# Altium footprint library Power_Lib_Altium.PcbLib: 383 footprints (part 18 of 24)
Each footprint in its own frame and in the unit in brackets; x right, y up, seen from the top. Pads: shape width x height; smd on the part's side, far side on the other; paste and mask are expansions set on the pad; w line width, h text height; cw(c..) or ccw(c..) is an arc to the next point about the centre after c.
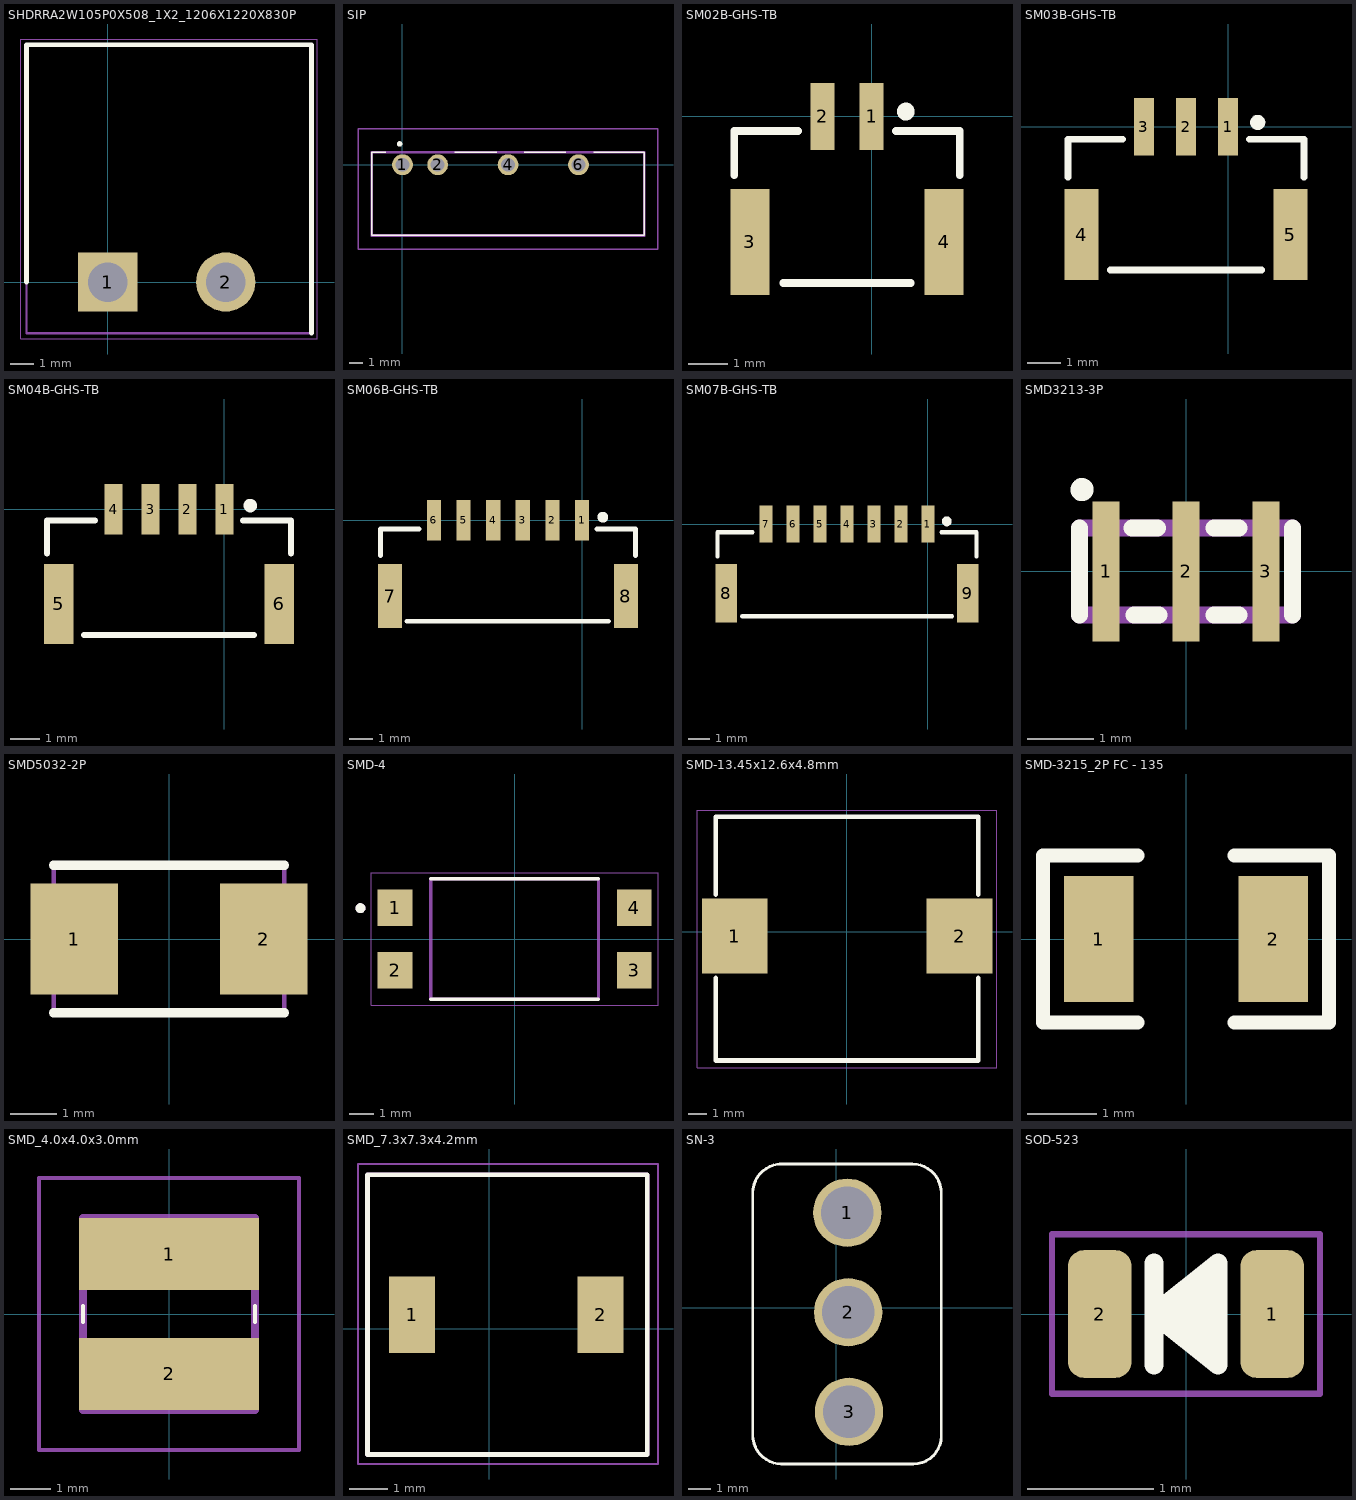
[diagram p17: the footprints below, top view; thin cyan lines are the x and y axes]

## SHDRRA2W105P0X508_1X2_1206X1220X830P [mm]
pads (2):
  rect 2.55x2.55 hole 1.7: 1(0,0)
  round 2.55 hole 1.7: 2(5.08,0)
Top Overlay:
  lines w0.2: -3.49,0 -3.49,10.2 8.77,10.2 8.77,-2.2
Mechanical 13:
  lines w0.1: -3.49,-2.2 8.77,-2.2 8.77,10.2 -3.49,10.2 -3.49,-2.2
Mechanical 15:
  lines w0.05: -3.74,-2.45 -3.74,10.45 9.02,10.45 9.02,-2.45 -3.74,-2.45
3D body "WJ2EDGRC-5.08-2P.stp": height 8.3, standoff -4, extent -3.49,-2.2 8.57,10

## SIP [mm]
pads (4):
  round 1.5 hole 1: 1(0,0) 2(2.54,0) 4(7.62,0) 6(12.7,0)
Top Overlay:
  lines w0.1: -1.21,0.9 -2.21,0.9 -2.21,-5.1 17.44,-5.1 17.44,0.9 13.79,0.9 ; 3.79,0.9 6.79,0.9 ; 8.79,0.9 11.79,0.9
  lines w0.2: -0.31,1.5 cw(c-0.21,1.5) -0.11,1.5 cw(c-0.21,1.5) -0.31,1.5
Mechanical 13:
  lines w0.2: -2.21,-5.1 17.44,-5.1 17.44,0.9 -2.21,0.9 -2.21,-5.1
Mechanical 15:
  lines w0.1: -3.21,-6.1 18.44,-6.1 18.44,2.6 -3.21,2.6 -3.21,-6.1
3D body "IB0505LS-1WR3.stp": height 10.51, standoff -5, extent -2.21,-5.1 17.44,0.9

## SM02B-GHS-TB [mm] "GH02卧式"
height 4.25
pads (4):
  rect 0.6x1.7 smd: 1(0,0) 2(-1.25,0)
  rect 1x2.7 smd: 3(-3.1,-3.2) 4(1.85,-3.2)
Top Overlay:
  circle w0.254: c0.875,0.125 r0.1
  lines w0.2: -3.5,-1.5 -3.5,-0.375 -1.875,-0.375 ; -2.25,-4.25 1,-4.25 ; 0.625,-0.375 2.25,-0.375 2.25,-1.5
3D body "SM02B-GHS-TB.STEP": height 4.35, standoff 0, extent -3.5,-4.3 2.25,0.55

## SM03B-GHS-TB [mm] "GH03卧式"
height 4.25
pads (5):
  rect 0.6x1.7 smd: 1(0,0) 2(-1.25,0) 3(-2.5,0)
  rect 1x2.7 smd: 4(-4.35,-3.2) 5(1.85,-3.2)
Top Overlay:
  circle w0.254: c0.875,0.125 r0.1
  lines w0.2: -4.75,-1.5 -4.75,-0.375 -3.125,-0.375 ; -3.5,-4.25 1,-4.25 ; 0.625,-0.375 2.25,-0.375 2.25,-1.5
3D body "SM03B-GHS-TB.STEP": height 4.35, standoff 0, extent -4.75,-4.3 2.25,0.55

## SM04B-GHS-TB [mm] "GH04卧式"
height 4.25
pads (6):
  rect 0.6x1.7 smd: 1(0,0) 2(-1.25,0) 3(-2.5,0) 4(-3.75,0)
  rect 1x2.7 smd: 5(-5.6,-3.2) 6(1.85,-3.2)
Top Overlay:
  circle w0.254: c0.875,0.125 r0.1
  lines w0.2: -6,-1.5 -6,-0.375 -4.375,-0.375 ; -4.75,-4.25 1,-4.25 ; 0.625,-0.375 2.25,-0.375 2.25,-1.5
3D body "SM04B-GHS-TB.STEP": height 4.35, standoff 0, extent -6,-4.3 2.25,0.55

## SM06B-GHS-TB [mm] "GH06卧式"
height 4.25
pads (8):
  rect 0.6x1.7 smd: 1(0,0) 2(-1.25,0) 3(-2.5,0) 4(-3.75,0) 5(-5,0) 6(-6.25,0)
  rect 1x2.7 smd: 7(-8.1,-3.2) 8(1.85,-3.2)
Top Overlay:
  circle w0.254: c0.875,0.125 r0.1
  lines w0.2: -8.5,-1.5 -8.5,-0.375 -6.875,-0.375 ; -7.391,-4.267 1.118,-4.267 ; 0.625,-0.375 2.25,-0.375 2.25,-1.5
3D body "SM06B-GHS-TB.STEP": height 4.35, standoff 0, extent -8.5,-4.3 2.25,0.55

## SM07B-GHS-TB [mm] "GH07卧式"
height 4.25
pads (9):
  rect 0.6x1.7 smd: 1(0,0) 2(-1.25,0) 3(-2.5,0) 4(-3.75,0) 5(-5,0) 6(-6.25,0) 7(-7.5,0)
  rect 1x2.7 smd: 8(-9.35,-3.2) 9(1.85,-3.2)
Top Overlay:
  circle w0.254: c0.875,0.125 r0.1
  lines w0.2: -9.75,-1.5 -9.75,-0.375 -8.125,-0.375 ; -8.611,-4.267 1.118,-4.267 ; 0.625,-0.375 2.25,-0.375 2.25,-1.5
3D body "SM07B-GHS-TB.STEP": height 4.35, standoff 0, extent -9.75,-4.3 2.25,0.55

## SMD3213-3P [mm]
pads (3):
  rect 0.4x2.1 smd: 1(-1.2,0) 2(0,0) 3(1.2,0)
Top Overlay:
  circle w0.254: c-1.559,1.228 r0.046
  lines w0.254: -1.6,-0.65 -1.6,0.65 ; -0.807,0.65 -0.428,0.65 ; -0.783,-0.65 -0.404,-0.65 ; 0.417,-0.65 0.796,-0.65 ; 0.417,0.65 0.796,0.65 ; 1.6,-0.65 1.6,0.65
Mechanical 13:
  lines w0.254: -1.6,-0.65 1.6,-0.65 1.6,0.65 -1.6,0.65 -1.6,-0.65
3D body "CSTCE8M00G55-R0.stp": height 0.7, standoff 0, extent -1.6,-0.65 1.6,0.65

## SMD5032-2P [mm]
pads (2):
  rect 1.9x2.4 smd: 1(-2.05,0) 2(2.05,0)
Top Overlay:
  lines w0.2: -2.5,-1.6 2.5,-1.6 -2.5,-1.6 ; -2.5,1.6 2.5,1.6 -2.5,1.6
Mechanical 13:
  lines w0.1: -2.5,-1.6 2.5,-1.6 2.5,1.6 -2.5,1.6 -2.5,-1.6
3D body "ECS-160-12-30-AEM-TR.stp": height 1.5, standoff 0, extent -2.81,-1.6 2.81,1.6

## SMD-4 [mm]
pads (4):
  rect 1.41x1.47 smd: 1(-4.85,1.27) 2(-4.85,-1.27) 3(4.85,-1.27) 4(4.85,1.27)
Top Overlay:
  circle w0.2: c-6.25,1.25 r0.1
  lines w0.127: -3.4,-2.44 3.4,-2.44 ; -3.4,2.44 3.4,2.44
Mechanical 13:
  circle w0.2: c-6.25,1.25 r0.1
  circle w0.2: c-6.25,1.25 r0.1
  lines w0.127: -3.4,-2.44 3.4,-2.44 ; -3.4,-2.44 -3.4,2.44 ; -3.4,-2.44 3.4,-2.44 ; -3.4,-2.44 -3.4,2.44 ; -3.4,2.44 3.4,2.44 ; -3.4,2.44 3.4,2.44 ; 3.4,-2.44 3.4,2.44 ; 3.4,-2.44 3.4,2.44
Mechanical 15:
  lines w0.05: -5.81,-2.69 -5.81,2.69 5.81,2.69 5.81,-2.69 -5.81,-2.69

## SMD-13.45x12.6x4.8mm [mm]
pads (2):
  rect 3.5x4 smd: 1(-5.975,-0.25) 2(6.025,-0.25)
Top Overlay:
  lines w0.254: -6.976,-2.481 -6.976,-6.875 7.024,-6.875 ; -6.975,1.981 -6.975,6.123 7.025,6.123 7.025,1.981 ; 7.025,-6.875 7.025,-2.481
Mechanical 15:
  lines w0.05: -7.979,-7.256 8.023,-7.256 8.023,6.46 -7.979,6.46 -7.979,1.507 -7.979,-7.256
3D body: height 5, standoff 0, extent -6.963,-6.875 7.007,6.079

## SMD-3215_2P FC - 135 [mm]
pads (2):
  rect 1x1.8 smd: 1(-1.25,0) 2(1.25,0)
Top Overlay:
  lines w0.2: -0.695,-1.2 -2.05,-1.2 -2.05,1.2 -0.695,1.2 ; 0.695,-1.2 2.05,-1.2 2.05,1.2 0.695,1.2

## SMD_4.0x4.0x3.0mm [mm]
pads (2):
  rect 4.5x1.8 smd: 1(0,1.5) 2(0,-1.5)
Top Overlay:
  lines w0.1: -2.15,-0.2 -2.15,0.2 ; 2.15,-0.2 2.15,0.2
Mechanical 13:
  lines w0.2: -2.15,-2.4 2.15,-2.4 2.15,2.4 -2.15,2.4 -2.15,-2.4
Mechanical 15:
  lines w0.1: -3.25,-3.4 3.25,-3.4 3.25,3.4 -3.25,3.4 -3.25,-3.4

## SMD_7.3x7.3x4.2mm [mm]
pads (2):
  rect 1.2x2 smd: 1(-2.02,0.37) 2(2.9,0.37)
Top Overlay:
  lines w0.127: -3.18,-3.28 -3.18,4.02 4.12,4.02 4.12,-3.28 -3.18,-3.28
Mechanical 13:
  lines w0.127: -3.18,-3.28 -3.18,4.02 4.12,4.02 4.12,-3.28 -3.18,-3.28
Mechanical 15:
  lines w0.05: -3.43,-3.53 4.4,-3.53 4.4,4.3 -3.43,4.3 -3.43,-3.53
3D body: height 3, standoff 0, extent -3.177,-3.277 4.1,4

## SN-3 [mm]
pads (3):
  round 3 hole 2.3: 1(0.483,4.171) 2(0.521,-0.203) 3(0.558,-4.578)
Top Overlay:
  lines w0.127: -2.502,6.311 0.419,6.311 3.34,6.311 cw(c3.34,5.041) 4.61,5.041 4.61,-5.652 cw(c3.391,-5.652) 3.391,-6.871 ; -2.421,-6.867 3.391,-6.871 ; -2.4,-6.871 cw(c-2.4,-5.601) -3.67,-5.601 -3.67,5.041 cw(c-2.4,5.041) -2.4,6.311 ; 1.511,-6.871 3.391,-6.871
3D body "User Library-7101SYZBE CK switch.SLDPRT": height 29.71, standoff -2.67, extent -2.923,-6.586 3.937,6.129

## SOD-523 [mil]
height 45.28
pads (2):
  rrect50% 20x40 smd: 1(27,0) 2(-27,0)
Top Overlay:
  region: 10,-16 10,16 -10,0
  lines w6: -10,-16 -10,16 ; -10,0 10,-16 10,16 -10,0
Mechanical 13:
  lines w2: -10,0 10,0 ; 0,-10 0,10
Mechanical 14:
  lines w2: -42,-25 -42,25 42,25 42,-25 -42,-25
3D body "User Library-SOD-523F.STEP": height 27.56, standoff 0, extent -31.5,-15.7 31.5,15.7